# Altium schematic symbol library Electronic Devices_LIB.SchLib: 703 symbols (part 4 of 8) (continued)
## IC_MPU_ARM_1.5GHZ_MIMX8MD6DVAJZAB (continued)
part D pins: F21 NAND_CE2_B, G19 NAND_ALE, G20 NAND_DATA00, G21 NAND_CE1_B, H19 NAND_CE0_B, H20 NAND_CE3_B, H21 NAND_CLE, H22 NAND_DATA02, J20 NAND_DATA01, J21 NAND_DATA03, J22 NAND_DATA05, K19 NAND_RE_B, K20 NAND_READY_B, K21 NAND_WP_B, K22 NAND_WE_B, L19 NAND_DATA06, L20 NAND_DATA04, M19 NAND_DATA07, M20 NAND_DQS
part E pins: N19 ENET_MDIO, N20 ENET_MDC, P19 ENET_TX_CTL, P20 ENET_TD3, R19 ENET_TD2, R20 ENET_TD0, R21 ENET_TD1, T19 ENET_TXC, T20 ENET_RXC, T21 ENET_RX_CTL, U19 ENET_RD0, U20 ENET_RD2, U21 ENET_RD1, V19 ENET_RD3
part F pins: L21 SD2_CD_B, L22 SD2_CLK, L24 SD1_CMD, L25 SD1_CLK, M21 SD2_WP, M22 SD2_CMD, M24 SD1_DATA1, M25 SD1_DATA0, N21 SD2_DATA1, N22 SD2_DATA0, N24 SD1_DATA4, N25 SD1_DATA2, P21 SD2_DATA3, P22 SD2_DATA2, P24 SD1_DATA5, P25 SD1_DATA3, R22 SD2_RESET_B, R24 SD1_RESET_B, R25 SD1_DATA6, T24 SD1_STROBE, T25 SD1_DATA7
part G pins: A3 SAI1_MCLK, B2 SAI1_TXD2, B3 SAI1_TXD6, C1 SAI1_TXD7, C2 SAI1_TXD5, C3 SAI3_TXD, C4 SAI3_TXC, D1 SAI1_TXD3, D2 SAI1_TXD4, D3 SAI3_MCLK, E1 SAI1_TXC, E2 SAI1_TXD1, E6 SPDIF_EXT_CLK, F1 SAI1_RXD5, F2 SAI1_TXD0, F3 SAI3_RXD, F4 SAI3_RXC, F6 SPDIF_TX, G1 SAI1_RXD7, G2 SAI1_RXD6, G3 SAI3_TXFS, G4 SAI3_RXFS, G5 SAI2_TXD0, G6 SPDIF_RX, H1 SAI1_TXFS, H2 SAI1_RXD2, H3 SAI2_RXC, H4 SAI2_TXFS, H5 SAI2_MCLK, H6 SAI2_RXD0, J1 SAI1_RXD4, J2 SAI1_RXD3, J4 SAI2_RXFS, J5 SAI2_TXC, K1 SAI1_RXC, K2 SAI1_RXD0, K4 SAI5_MCLK, K5 SAI5_RXD3, L1 SAI1_RXFS, L2 SAI1_RXD1, L4 SAI5_RXD1, L5 SAI5_RXC, M4 SAI5_RXD2, M5 SAI5_RXD0, N4 SAI5_RXFS
part H pins: A4 ECSPI1_MOSI, A5 ECSPI2_SS0, A6 UART3_RXD, A7 UART1_TXD, B4 ECSPI1_MISO, B5 ECSPI2_MISO, B6 UART2_RXD, B7 UART3_TXD, C5 ECSPI2_SCLK, C6 UART4_RXD, C7 UART1_RXD, D4 ECSPI1_SS0, D5 ECSPI1_SCLK, D6 UART2_TXD, D7 UART4_TXD, E5 ECSPI2_MOSI, E7 I2C1_SCL, E8 I2C1_SDA, E9 I2C3_SDA, F7 I2C2_SDA, F8 I2C4_SCL, F9 I2C4_SDA, G7 I2C2_SCL, G8 I2C3_SCL, J6 GPIO1_IO15, K6 GPIO1_IO13, K7 GPIO1_IO14, L6 GPIO1_IO11, L7 GPIO1_IO12, M6 GPIO1_IO09, M7 GPIO1_IO10, N5 GPIO1_IO06, N6 GPIO1_IO07, N7 GPIO1_IO08, P4 GPIO1_IO03, P5 GPIO1_IO04, P7 GPIO1_IO05, R4 GPIO1_IO02, T6 GPIO1_IO00, T7 GPIO1_IO01
part I pins: R23 CLK1_P, T5 JTAG_TCK, T22 CLK2_P, T23 CLK1_N, U5 JTAG_TDO, U6 JTAG_TRST_B, U7 JTAG_MOD, U22 CLK2_N, U24 XTALO_25M, U25 XTALI_25M, V5 JTAG_TMS, V6 BOOT_MODE1, V7 TEST_MODE, V20 PMIC_ON_REQ, V21 PMIC_STBY_REQ, V22 RTC, V24 XTALO_27M, V25 XTALI_27M, W5 JTAG_TDI, W6 BOOT_MODE0, W19 RTC_RESET_B, W20 POR_B, W21 ONOFF
part J pins: A19 MIPI_CSI2_CLK_N, A20 MIPI_CSI2_D1_N, A21 MIPI_CSI2_D2_N, A22 MIPI_CSI1_CLK_N, A23 MIPI_CSI1_D0_N, B19 MIPI_CSI2_CLK_P, B20 MIPI_CSI2_D1_P, B21 MIPI_CSI2_D2_P, B22 MIPI_CSI1_CLK_P, B23 MIPI_CSI1_D0_P, B24 MIPI_CSI1_D2_N, C19 MIPI_CSI2_D3_N, C20 MIPI_CSI2_D0_N, C21 MIPI_CSI1_D3_N, C22 MIPI_CSI1_D1_N, C23 MIPI_CSI1_D2_P, D19 MIPI_CSI2_D3_P, D20 MIPI_CSI2_D0_P, D21 MIPI_CSI1_D3_P, D22 MIPI_CSI1_D1_P
part K pins: M1 HDMI_TX_P_LN_3, M2 HDMI_TX_M_LN_3, N1 HDMI_TX_M_LN_2, N2 HDMI_TX_P_LN_2, P1 HDMI_REXT, P3 HDMI_DDC_SDA, R1 HDMI_REFCLK_N, R2 HDMI_REFCLK_P, R3 HDMI_DDC_SCL, T1 HDMI_TX_P_LN_0, T2 HDMI_TX_M_LN_0, U1 HDMI_TX_M_LN_1, U2 HDMI_TX_P_LN_1, V1 HDMI_AUX_P, V2 HDMI_AUX_N, W2 HDMI_HPD, W3 HDMI_CEC
part L pins: C25 PCIE2_RESREF, D24 PCIE2_RXN_N, D25 PCIE2_RXN_P, E24 PCIE2_TXN_N, E25 PCIE2_TXN_P, F24 PCIE2_REF_PAD_CLK_N, F25 PCIE2_REF_PAD_CLK_P, G25 PCIE1_RESREF, H24 PCIE1_RXN_N, H25 PCIE1_RXN_P, J24 PCIE1_TXN_N, J25 PCIE1_TXN_P, K24 PCIE1_REF_PAD_CLK_N, K25 PCIE1_REF_PAD_CLK_P
part M pins: A15 MIPI_DSI_D3_N, A16 MIPI_DSI_D1_N, A17 MIPI_DSI_D0_N, A18 MIPI_DSI_D2_N, B15 MIPI_DSI_D3_P, B16 MIPI_DSI_D1_P, B17 MIPI_DSI_D0_P, B18 MIPI_DSI_D2_P, C16 MIPI_DSI_CLK_N, C17 MIPI_DSI_REXT, D16 MIPI_DSI_CLK_P
part N pins: A8 USB2_RX_P, A9 USB2_TX_P, A10 USB2_DP, A11 USB1_RESREF, A12 USB1_RX_P, A13 USB1_TX_P, A14 USB1_DP, B8 USB2_RX_N, B9 USB2_TX_N, B10 USB2_DN, B11 USB2_RESREF, B12 USB1_RX_N, B13 USB1_TX_N, B14 USB1_DN, C9 USB2_ID, C14 USB1_ID, D9 USB2_VBUS, D14 USB1_VBUS

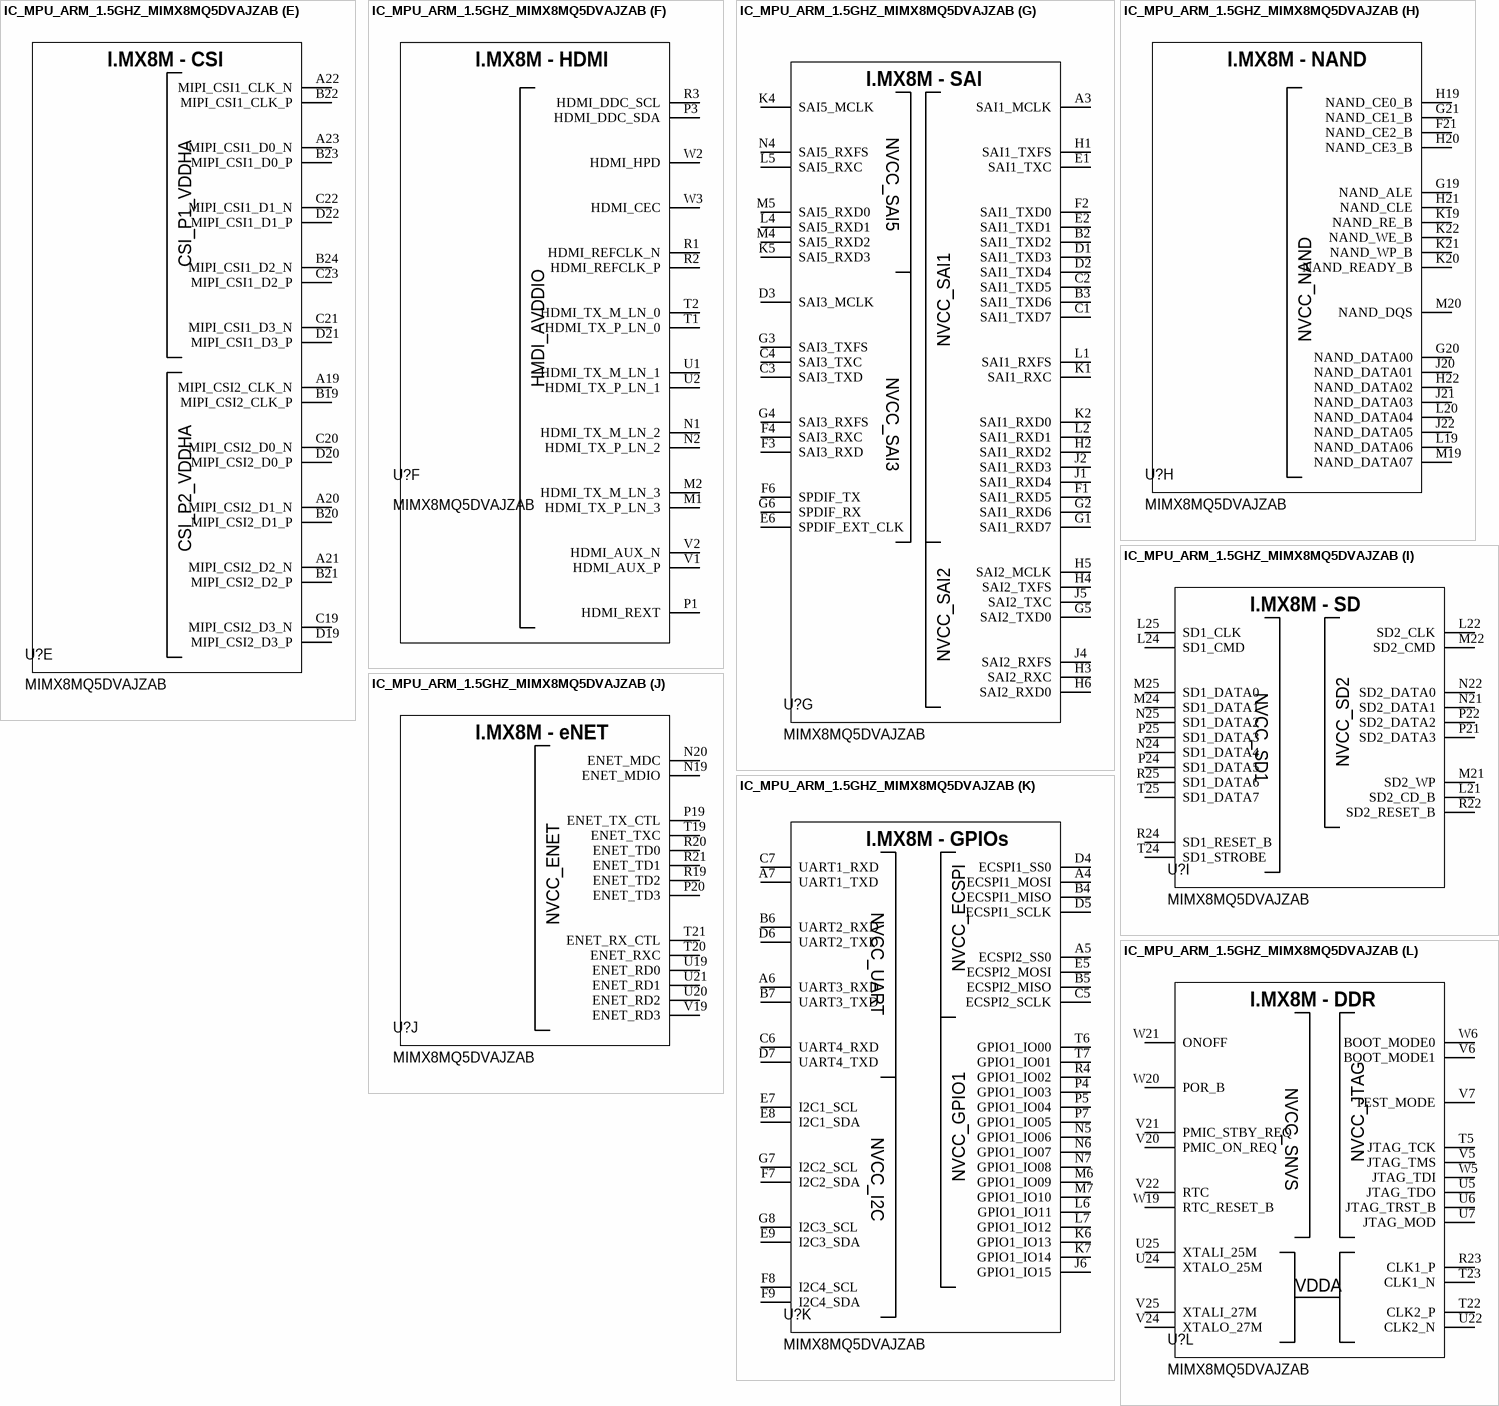
[diagram p21: symbol IC_MPU_ARM_1.5GHZ_MIMX8MQ5DVAJZAB]

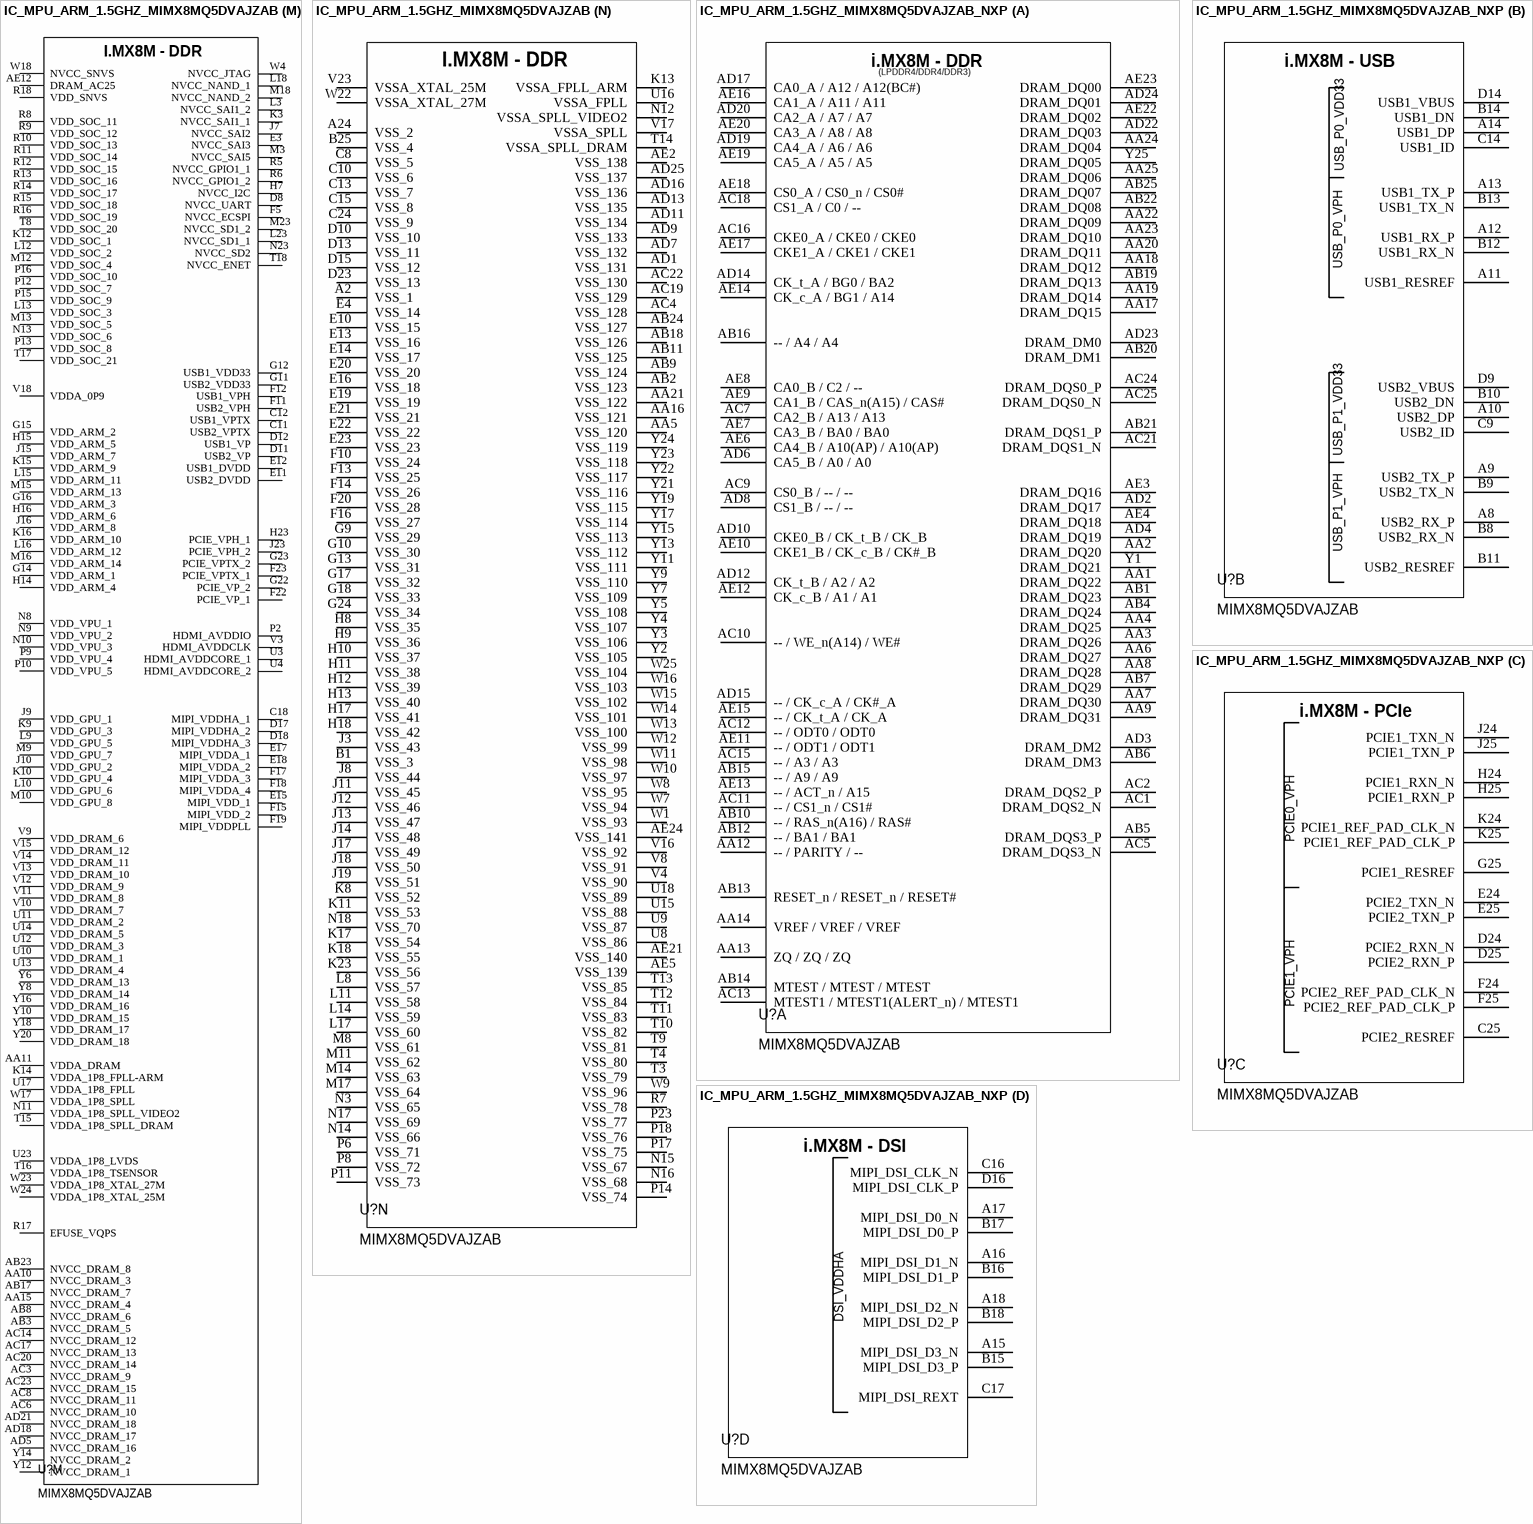
[diagram p22: symbols IC_MPU_ARM_1.5GHZ_MIMX8MQ5DVAJZAB to IC_MPU_ARM_1.5GHZ_MIMX8MQ5DVAJZAB_NXP]

## IC_MPU_ARM_1.5GHZ_MIMX8MQ5DVAJZAB
designator U?, comment MIMX8MQ5DVAJZAB
SOC i.MX 8M ARM Cortex A53/ARM Cortex M4 621-Pin FBGA Tray; Manufacturer: NXP Semiconductors; Supplier 1: Digi-Key; Manufacturer Part Number: MIMX8MQ5DVAJZAB; RoHS: Yes; Category: Microprocessors; Stock 1: 760; Pricing 1: 1=66.08, 10=53.977, 90=48.753 (USD); RoHS Compliant: Yes; Supplier Part Number 1: 568-14719-ND
footprint IC_MPU_BGA621C65P25X25_1700X1700X218 (621-FCPBGA (17x17))
part A pins: AA1 DRAM_DQ22, AA2 DRAM_DQ20, AA3 DRAM_DQ26, AA4 DRAM_DQ25, AA6 DRAM_DQ27, AA7 DRAM_DQ30, AA8 DRAM_DQ28, AA9 DRAM_DQ31, AA12 DRAM_AC27, AA13 DRAM_ZN, AA14 DRAM_VREF, AA17 DRAM_DQ15, AA18 DRAM_DQ12, AA19 DRAM_DQ14, AA20 DRAM_DQ11, AA22 DRAM_DQ09, AA23 DRAM_DQ10, AA24 DRAM_DQ04, AA25 DRAM_DQ06, AB1 DRAM_DQ23, AB4 DRAM_DQ24, AB5 DRAM_DQS3_P, AB6 DRAM_DM3, AB7 DRAM_DQ29, AB10 DRAM_AC35, AB12 DRAM_AC26, AB13 DRAM_RESET_N, AB14 DRAM_AC19, AB15 DRAM_AC07, AB16 DRAM_AC14, AB19 DRAM_DQ13, AB20 DRAM_DM1, AB21 DRAM_DQS1_P, AB22 DRAM_DQ08, AB25 DRAM_DQ07, AC1 DRAM_DQS2_N, AC2 DRAM_DQS2_P, AC5 DRAM_DQS3_N, AC7 DRAM_AC28, AC9 DRAM_AC23, AC10 DRAM_AC34, AC11 DRAM_AC38, AC12 DRAM_AC36, AC13 DRAM_ALERT_N, AC15 DRAM_AC15, AC16 DRAM_AC00, AC18 DRAM_AC03, AC21 DRAM_DQS1_N, AC24 DRAM_DQS0_P, AC25 DRAM_DQS0_N, AD2 DRAM_DQ17, AD3 DRAM_DM2, AD4 DRAM_DQ19, AD6 DRAM_AC31, AD8 DRAM_AC22, AD10 DRAM_AC20, AD12 DRAM_AC24, AD14 DRAM_AC04, AD15 DRAM_AC17, AD17 DRAM_AC08, AD19 DRAM_AC12, AD20 DRAM_AC10, AD22 DRAM_DQ03, AD23 DRAM_DM0, AD24 DRAM_DQ01, AE3 DRAM_DQ16, AE4 DRAM_DQ18, AE6 DRAM_AC30, AE7 DRAM_AC29, AE8 DRAM_AC32, AE9 DRAM_AC33, AE10 DRAM_AC21, AE11 DRAM_AC37, AE12 DRAM_AC25, AE13 DRAM_AC06, AE14 DRAM_AC05, AE15 DRAM_AC16, AE16 DRAM_AC09, AE17 DRAM_AC01, AE18 DRAM_AC02, AE19 DRAM_AC13, AE20 DRAM_AC11, AE22 DRAM_DQ02, AE23 DRAM_DQ00, Y1 DRAM_DQ21, Y25 DRAM_DQ05
part B pins: A8 USB2_RX_P, A9 USB2_TX_P, A10 USB2_DP, A11 USB1_RESREF, A12 USB1_RX_P, A13 USB1_TX_P, A14 USB1_DP, B8 USB2_RX_N, B9 USB2_TX_N, B10 USB2_DN, B11 USB2_RESREF, B12 USB1_RX_N, B13 USB1_TX_N, B14 USB1_DN, C9 USB2_ID, C14 USB1_ID, D9 USB2_VBUS, D14 USB1_VBUS
part C pins: C25 PCIE2_RESREF, D24 PCIE2_RXN_N, D25 PCIE2_RXN_P, E24 PCIE2_TXN_N, E25 PCIE2_TXN_P, F24 PCIE2_REF_PAD_CLK_N, F25 PCIE2_REF_PAD_CLK_P, G25 PCIE1_RESREF, H24 PCIE1_RXN_N, H25 PCIE1_RXN_P, J24 PCIE1_TXN_N, J25 PCIE1_TXN_P, K24 PCIE1_REF_PAD_CLK_N, K25 PCIE1_REF_PAD_CLK_P
part D pins: A15 MIPI_DSI_D3_N, A16 MIPI_DSI_D1_N, A17 MIPI_DSI_D0_N, A18 MIPI_DSI_D2_N, B15 MIPI_DSI_D3_P, B16 MIPI_DSI_D1_P, B17 MIPI_DSI_D0_P, B18 MIPI_DSI_D2_P, C16 MIPI_DSI_CLK_N, C17 MIPI_DSI_REXT, D16 MIPI_DSI_CLK_P
part E pins: A19 MIPI_CSI2_CLK_N, A20 MIPI_CSI2_D1_N, A21 MIPI_CSI2_D2_N, A22 MIPI_CSI1_CLK_N, A23 MIPI_CSI1_D0_N, B19 MIPI_CSI2_CLK_P, B20 MIPI_CSI2_D1_P, B21 MIPI_CSI2_D2_P, B22 MIPI_CSI1_CLK_P, B23 MIPI_CSI1_D0_P, B24 MIPI_CSI1_D2_N, C19 MIPI_CSI2_D3_N, C20 MIPI_CSI2_D0_N, C21 MIPI_CSI1_D3_N, C22 MIPI_CSI1_D1_N, C23 MIPI_CSI1_D2_P, D19 MIPI_CSI2_D3_P, D20 MIPI_CSI2_D0_P, D21 MIPI_CSI1_D3_P, D22 MIPI_CSI1_D1_P
part F pins: M1 HDMI_TX_P_LN_3, M2 HDMI_TX_M_LN_3, N1 HDMI_TX_M_LN_2, N2 HDMI_TX_P_LN_2, P1 HDMI_REXT, P3 HDMI_DDC_SDA, R1 HDMI_REFCLK_N, R2 HDMI_REFCLK_P, R3 HDMI_DDC_SCL, T1 HDMI_TX_P_LN_0, T2 HDMI_TX_M_LN_0, U1 HDMI_TX_M_LN_1, U2 HDMI_TX_P_LN_1, V1 HDMI_AUX_P, V2 HDMI_AUX_N, W2 HDMI_HPD, W3 HDMI_CEC
part G pins: A3 SAI1_MCLK, B2 SAI1_TXD2, B3 SAI1_TXD6, C1 SAI1_TXD7, C2 SAI1_TXD5, C3 SAI3_TXD, C4 SAI3_TXC, D1 SAI1_TXD3, D2 SAI1_TXD4, D3 SAI3_MCLK, E1 SAI1_TXC, E2 SAI1_TXD1, E6 SPDIF_EXT_CLK, F1 SAI1_RXD5, F2 SAI1_TXD0, F3 SAI3_RXD, F4 SAI3_RXC, F6 SPDIF_TX, G1 SAI1_RXD7, G2 SAI1_RXD6, G3 SAI3_TXFS, G4 SAI3_RXFS, G5 SAI2_TXD0, G6 SPDIF_RX, H1 SAI1_TXFS, H2 SAI1_RXD2, H3 SAI2_RXC, H4 SAI2_TXFS, H5 SAI2_MCLK, H6 SAI2_RXD0, J1 SAI1_RXD4, J2 SAI1_RXD3, J4 SAI2_RXFS, J5 SAI2_TXC, K1 SAI1_RXC, K2 SAI1_RXD0, K4 SAI5_MCLK, K5 SAI5_RXD3, L1 SAI1_RXFS, L2 SAI1_RXD1, L4 SAI5_RXD1, L5 SAI5_RXC, M4 SAI5_RXD2, M5 SAI5_RXD0, N4 SAI5_RXFS
part H pins: F21 NAND_CE2_B, G19 NAND_ALE, G20 NAND_DATA00, G21 NAND_CE1_B, H19 NAND_CE0_B, H20 NAND_CE3_B, H21 NAND_CLE, H22 NAND_DATA02, J20 NAND_DATA01, J21 NAND_DATA03, J22 NAND_DATA05, K19 NAND_RE_B, K20 NAND_READY_B, K21 NAND_WP_B, K22 NAND_WE_B, L19 NAND_DATA06, L20 NAND_DATA04, M19 NAND_DATA07, M20 NAND_DQS
part I pins: L21 SD2_CD_B, L22 SD2_CLK, L24 SD1_CMD, L25 SD1_CLK, M21 SD2_WP, M22 SD2_CMD, M24 SD1_DATA1, M25 SD1_DATA0, N21 SD2_DATA1, N22 SD2_DATA0, N24 SD1_DATA4, N25 SD1_DATA2, P21 SD2_DATA3, P22 SD2_DATA2, P24 SD1_DATA5, P25 SD1_DATA3, R22 SD2_RESET_B, R24 SD1_RESET_B, R25 SD1_DATA6, T24 SD1_STROBE, T25 SD1_DATA7
part J pins: N19 ENET_MDIO, N20 ENET_MDC, P19 ENET_TX_CTL, P20 ENET_TD3, R19 ENET_TD2, R20 ENET_TD0, R21 ENET_TD1, T19 ENET_TXC, T20 ENET_RXC, T21 ENET_RX_CTL, U19 ENET_RD0, U20 ENET_RD2, U21 ENET_RD1, V19 ENET_RD3
part K pins: A4 ECSPI1_MOSI, A5 ECSPI2_SS0, A6 UART3_RXD, A7 UART1_TXD, B4 ECSPI1_MISO, B5 ECSPI2_MISO, B6 UART2_RXD, B7 UART3_TXD, C5 ECSPI2_SCLK, C6 UART4_RXD, C7 UART1_RXD, D4 ECSPI1_SS0, D5 ECSPI1_SCLK, D6 UART2_TXD, D7 UART4_TXD, E5 ECSPI2_MOSI, E7 I2C1_SCL, E8 I2C1_SDA, E9 I2C3_SDA, F7 I2C2_SDA, F8 I2C4_SCL, F9 I2C4_SDA, G7 I2C2_SCL, G8 I2C3_SCL, J6 GPIO1_IO15, K6 GPIO1_IO13, K7 GPIO1_IO14, L6 GPIO1_IO11, L7 GPIO1_IO12, M6 GPIO1_IO09, M7 GPIO1_IO10, N5 GPIO1_IO06, N6 GPIO1_IO07, N7 GPIO1_IO08, P4 GPIO1_IO03, P5 GPIO1_IO04, P7 GPIO1_IO05, R4 GPIO1_IO02, T6 GPIO1_IO00, T7 GPIO1_IO01
part L pins: R23 CLK1_P, T5 JTAG_TCK, T22 CLK2_P, T23 CLK1_N, U5 JTAG_TDO, U6 JTAG_TRST_B, U7 JTAG_MOD, U22 CLK2_N, U24 XTALO_25M, U25 XTALI_25M, V5 JTAG_TMS, V6 BOOT_MODE1, V7 TEST_MODE, V20 PMIC_ON_REQ, V21 PMIC_STBY_REQ, V22 RTC, V24 XTALO_27M, V25 XTALI_27M, W5 JTAG_TDI, W6 BOOT_MODE0, W19 RTC_RESET_B, W20 POR_B, W21 ONOFF
part M pins: AA10 NVCC_DRAM_3, AA11 VDDA_DRAM, AA15 NVCC_DRAM_4, AB3 NVCC_DRAM_5, AB8 NVCC_DRAM_6, AB17 NVCC_DRAM_7, AB23 NVCC_DRAM_8, AC3 NVCC_DRAM_9, AC6 NVCC_DRAM_10, AC8 NVCC_DRAM_11, AC14 NVCC_DRAM_12, AC17 NVCC_DRAM_13, AC20 NVCC_DRAM_14, AC23 NVCC_DRAM_15, AD5 NVCC_DRAM_16, AD18 NVCC_DRAM_17, AD21 NVCC_DRAM_18, AE12 DRAM_AC25, C11 USB2_VPTX, C12 USB1_VPTX, C18 MIPI_VDDHA_1, D8 NVCC_UART, D11 USB2_VP, D12 USB1_VP, D17 MIPI_VDDHA_2, D18 MIPI_VDDHA_3, E3 NVCC_SAI3, E11 USB2_DVDD, E12 USB1_DVDD, E15 MIPI_VDD_1, E17 MIPI_VDDA_1, E18 MIPI_VDDA_2, F5 NVCC_ECSPI, F11 USB2_VPH, F12 USB1_VPH, F15 MIPI_VDD_2, F17 MIPI_VDDA_3, F18 MIPI_VDDA_4, F19 MIPI_VDDPLL, F22 PCIE_VP_1, F23 PCIE_VPTX_1, G11 USB2_VDD33, G12 USB1_VDD33, G14 VDD_ARM_1, G15 VDD_ARM_2, G16 VDD_ARM_3, G22 PCIE_VP_2, G23 PCIE_VPTX_2, H7 NVCC_I2C, H14 VDD_ARM_4, H15 VDD_ARM_5, H16 VDD_ARM_6, H23 PCIE_VPH_1, J7 NVCC_SAI2, J9 VDD_GPU_1, J10 VDD_GPU_2, J15 VDD_ARM_7, J16 VDD_ARM_8, J23 PCIE_VPH_2, K3 NVCC_SAI1_1, K9 VDD_GPU_3, K10 VDD_GPU_4, K12 VDD_SOC_1, K14 VDDA_1P8_FPLL-ARM, K15 VDD_ARM_9, K16 VDD_ARM_10, L3 NVCC_SAI1_2, L9 VDD_GPU_5, L10 VDD_GPU_6, L12 VDD_SOC_2, L13 VDD_SOC_3, L15 VDD_ARM_11, L16 VDD_ARM_12, L18 NVCC_NAND_1, L23 NVCC_SD1_1, M3 NVCC_SAI5, M9 VDD_GPU_7, M10 VDD_GPU_8, M12 VDD_SOC_4, M13 VDD_SOC_5, M15 VDD_ARM_13, M16 VDD_ARM_14, M18 NVCC_NAND_2, M23 NVCC_SD1_2, N8 VDD_VPU_1, N9 VDD_VPU_2, N10 VDD_VPU_3, N11 VDDA_1P8_SPLL_VIDEO2, N13 VDD_SOC_6, N23 NVCC_SD2, P2 HDMI_AVDDIO, P9 VDD_VPU_4, P10 VDD_VPU_5, P12 VDD_SOC_7, P13 VDD_SOC_8, P15 VDD_SOC_9, P16 VDD_SOC_10, R5 NVCC_GPIO1_1, R6 NVCC_GPIO1_2, R8 VDD_SOC_11, R9 VDD_SOC_12, R10 VDD_SOC_13, R11 VDD_SOC_14, R12 VDD_SOC_15, R13 VDD_SOC_16, R14 VDD_SOC_17, R15 VDD_SOC_18, R16 VDD_SOC_19, R17 EFUSE_VQPS, R18 VDD_SNVS, T8 VDD_SOC_20, T15 VDDA_1P8_SPLL_DRAM, T16 VDDA_1P8_TSENSOR, T17 VDD_SOC_21, T18 NVCC_ENET, U3 HDMI_AVDDCORE_1, U4 HDMI_AVDDCORE_2, U10 VDD_DRAM_1, U11 VDD_DRAM_2, U12 VDD_DRAM_3, U13 VDD_DRAM_4, U14 VDD_DRAM_5, U17 VDDA_1P8_FPLL, U23 VDDA_1P8_LVDS, V3 HDMI_AVDDCLK, V9 VDD_DRAM_6, V10 VDD_DRAM_7, V11 VDD_DRAM_8, V12 VDD_DRAM_9, V13 VDD_DRAM_10, V14 VDD_DRAM_11, V15 VDD_DRAM_12, V18 VDDA_0P9, W4 NVCC_JTAG, W17 VDDA_1P8_SPLL, W18 NVCC_SNVS, W23 VDDA_1P8_XTAL_27M, W24 VDDA_1P8_XTAL_25M, Y6 VDD_DRAM_13, Y8 VDD_DRAM_14, Y10 VDD_DRAM_15, Y12 NVCC_DRAM_1, Y14 NVCC_DRAM_2, Y16 VDD_DRAM_16, Y18 VDD_DRAM_17, Y20 VDD_DRAM_18
part N pins: A2 VSS_1, A24 VSS_2, AA5 VSS_120, AA16 VSS_121, AA21 VSS_122, AB2 VSS_123, AB9 VSS_124, AB11 VSS_125, AB18 VSS_126, AB24 VSS_127, AC4 VSS_128, AC19 VSS_129, AC22 VSS_130, AD1 VSS_131, AD7 VSS_132, AD9 VSS_133, AD11 VSS_134, AD13 VSS_135, AD16 VSS_136, AD25 VSS_137, AE2 VSS_138, AE5 VSS_139, AE21 VSS_140, AE24 VSS_141, B1 VSS_3, B25 VSS_4, C8 VSS_5, C10 VSS_6, C13 VSS_7, C15 VSS_8, C24 VSS_9, D10 VSS_10, D13 VSS_11, D15 VSS_12, D23 VSS_13, E4 VSS_14, E10 VSS_15, E13 VSS_16, E14 VSS_17, E16 VSS_18, E19 VSS_19, E20 VSS_20, E21 VSS_21, E22 VSS_22, E23 VSS_23, F10 VSS_24, F13 VSS_25, F14 VSS_26, F16 VSS_27, F20 VSS_28, G9 VSS_29, G10 VSS_30, G13 VSS_31, G17 VSS_32, G18 VSS_33, G24 VSS_34, H8 VSS_35, H9 VSS_36, H10 VSS_37, H11 VSS_38, H12 VSS_39, H13 VSS_40, H17 VSS_41, H18 VSS_42, J3 VSS_43, J8 VSS_44, J11 VSS_45, J12 VSS_46, J13 VSS_47, J14 VSS_48, J17 VSS_49, J18 VSS_50, J19 VSS_51, K8 VSS_52, K11 VSS_53, K13 VSSA_FPLL_ARM, K17 VSS_54, K18 VSS_55, K23 VSS_56, L8 VSS_57, L11 VSS_58, L14 VSS_59, L17 VSS_60, M8 VSS_61, M11 VSS_62, M14 VSS_63, M17 VSS_64, N3 VSS_65, N12 VSSA_SPLL_VIDEO2, N14 VSS_66, N15 VSS_67, N16 VSS_68, N17 VSS_69, N18 VSS_70, P6 VSS_71, P8 VSS_72, P11 VSS_73, P14 VSS_74, P17 VSS_75, P18 VSS_76, P23 VSS_77, R7 VSS_78, T3 VSS_79, T4 VSS_80, T9 VSS_81, T10 VSS_82, T11 VSS_83, T12 VSS_84, T13 VSS_85, T14 VSSA_SPLL_DRAM, U8 VSS_86, U9 VSS_87, U15 VSS_88, U16 VSSA_FPLL, U18 VSS_89, V4 VSS_90, V8 VSS_91, V16 VSS_92, V17 VSSA_SPLL, V23 VSSA_XTAL_25M, W1 VSS_93, W7 VSS_94, W8 VSS_95, W9 VSS_96, W10 VSS_97, W11 VSS_98, W12 VSS_99, W13 VSS_100, W14 VSS_101, W15 VSS_102, W16 VSS_103, W22 VSSA_XTAL_27M, W25 VSS_104, Y2 VSS_105, Y3 VSS_106, Y4 VSS_107, Y5 VSS_108, Y7 VSS_109, Y9 VSS_110, Y11 VSS_111, Y13 VSS_112, Y15 VSS_113, Y17 VSS_114, Y19 VSS_115, Y21 VSS_116, Y22 VSS_117, Y23 VSS_118, Y24 VSS_119

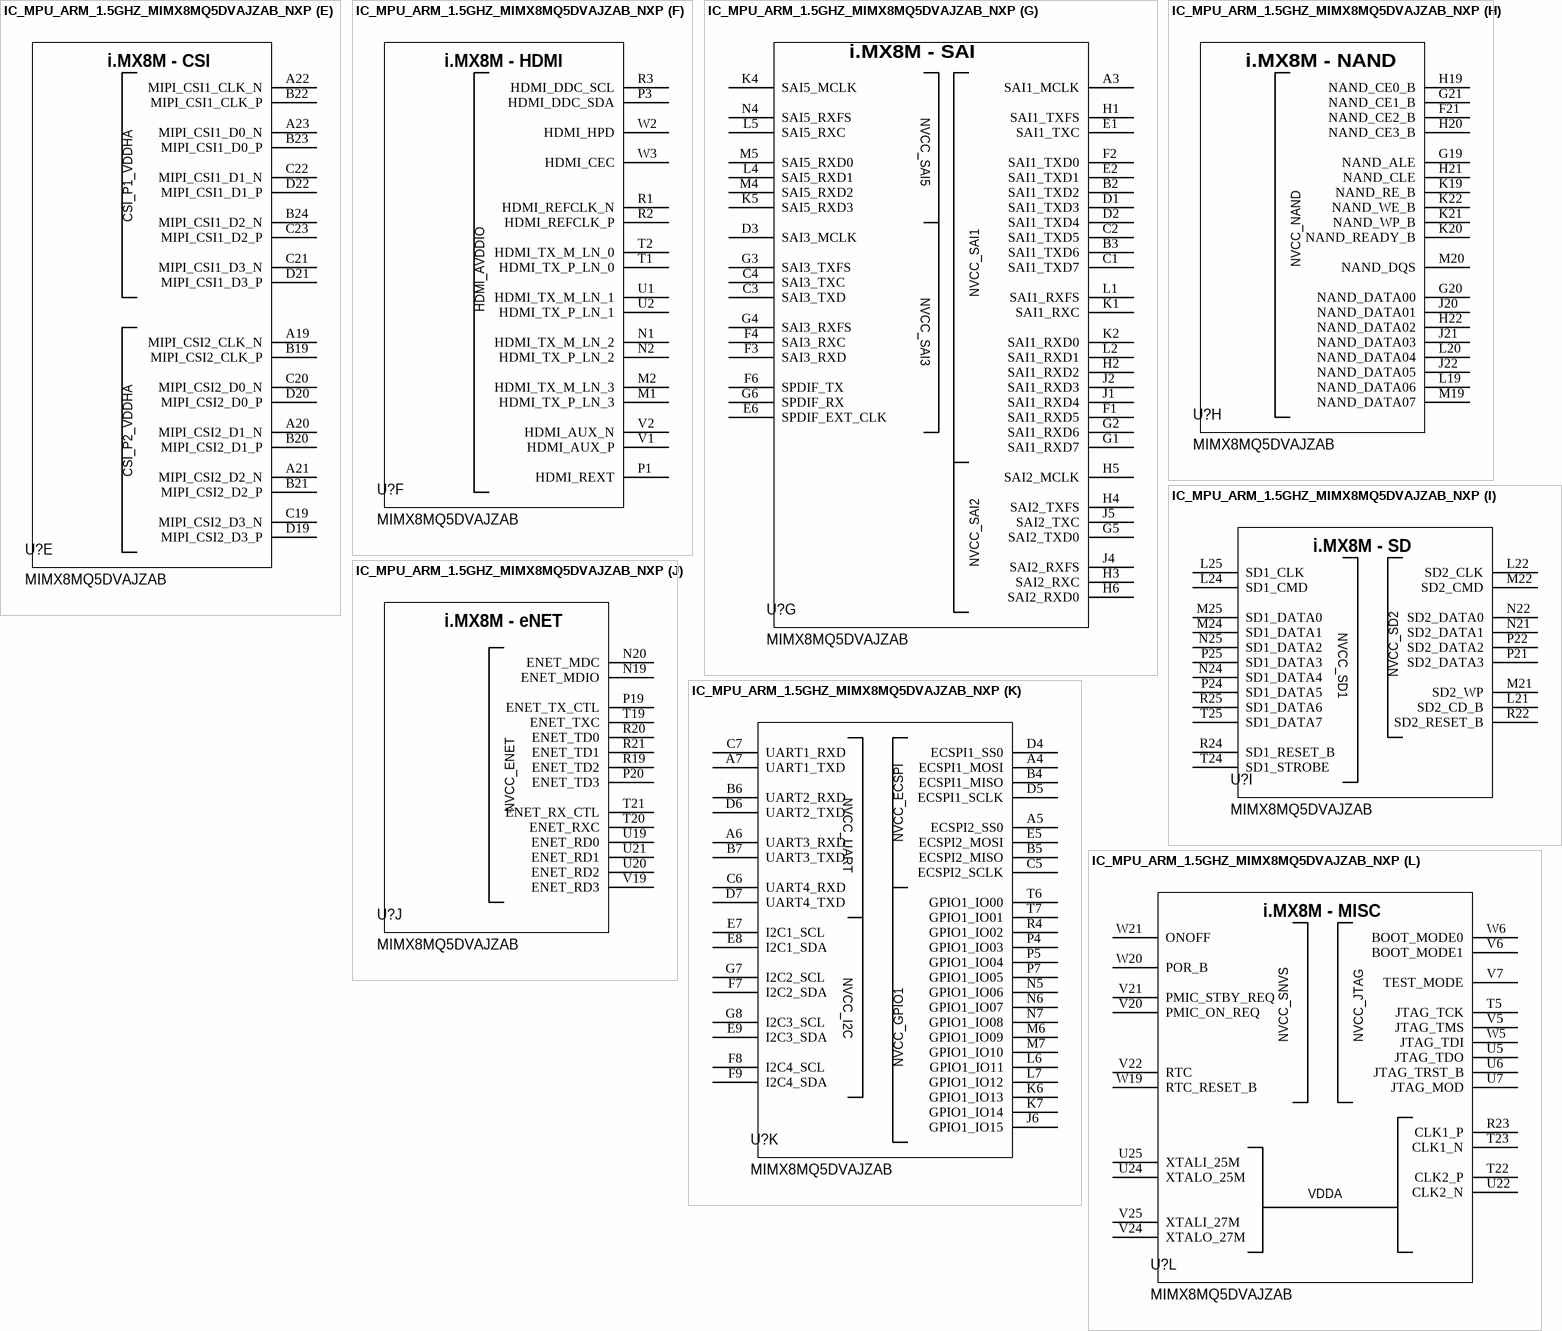
[diagram p23: symbol IC_MPU_ARM_1.5GHZ_MIMX8MQ5DVAJZAB_NXP]

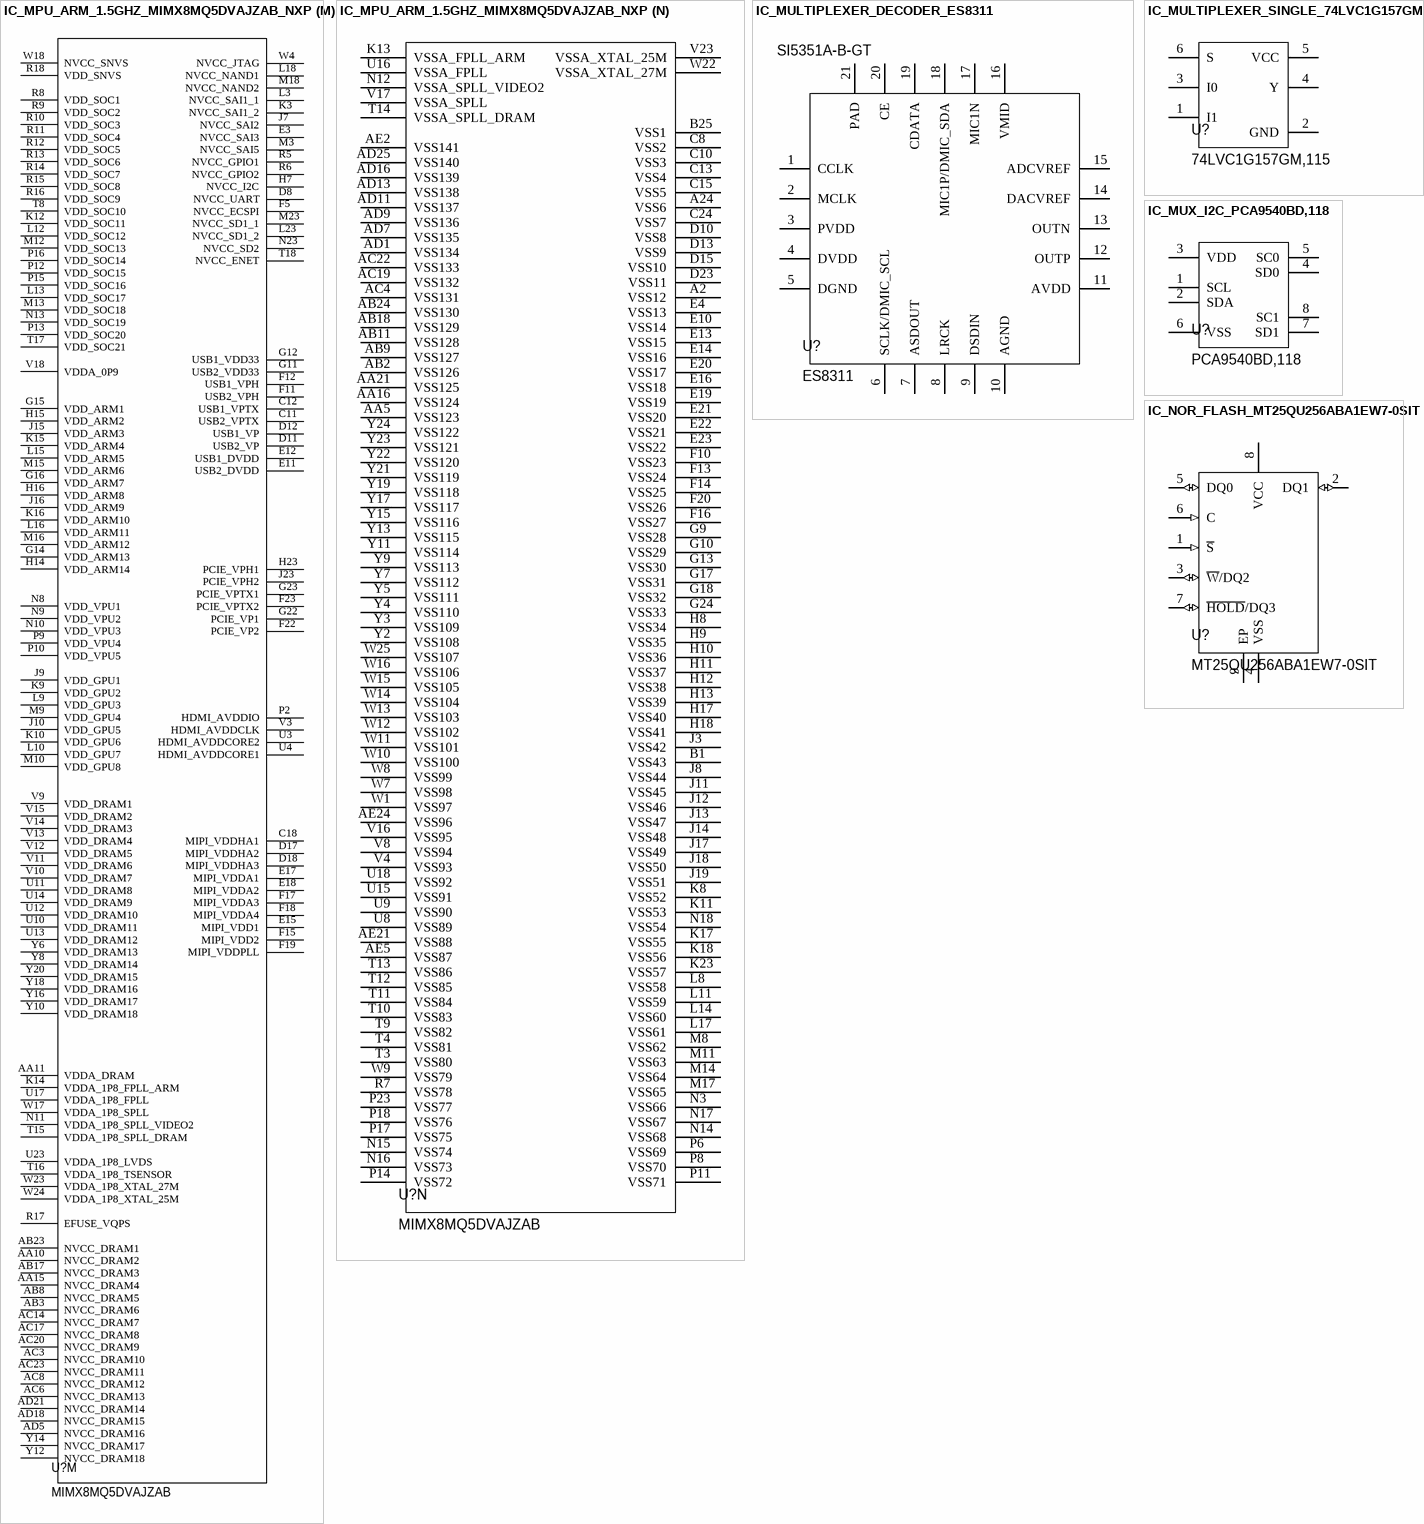
[diagram p24: symbols IC_MPU_ARM_1.5GHZ_MIMX8MQ5DVAJZAB_NXP to IC_NOR_FLASH_MT25QU256ABA1EW7-0SIT]